# Altium footprint library Connector.PcbLib: 148 footprints (part 2 of 10)
Each footprint in its own frame and in the unit in brackets; x right, y up, seen from the top. Pads: shape width x height; smd on the part's side, far side on the other; paste and mask are expansions set on the pad; w line width, h text height; cw(c..) or ccw(c..) is an arc to the next point about the centre after c.
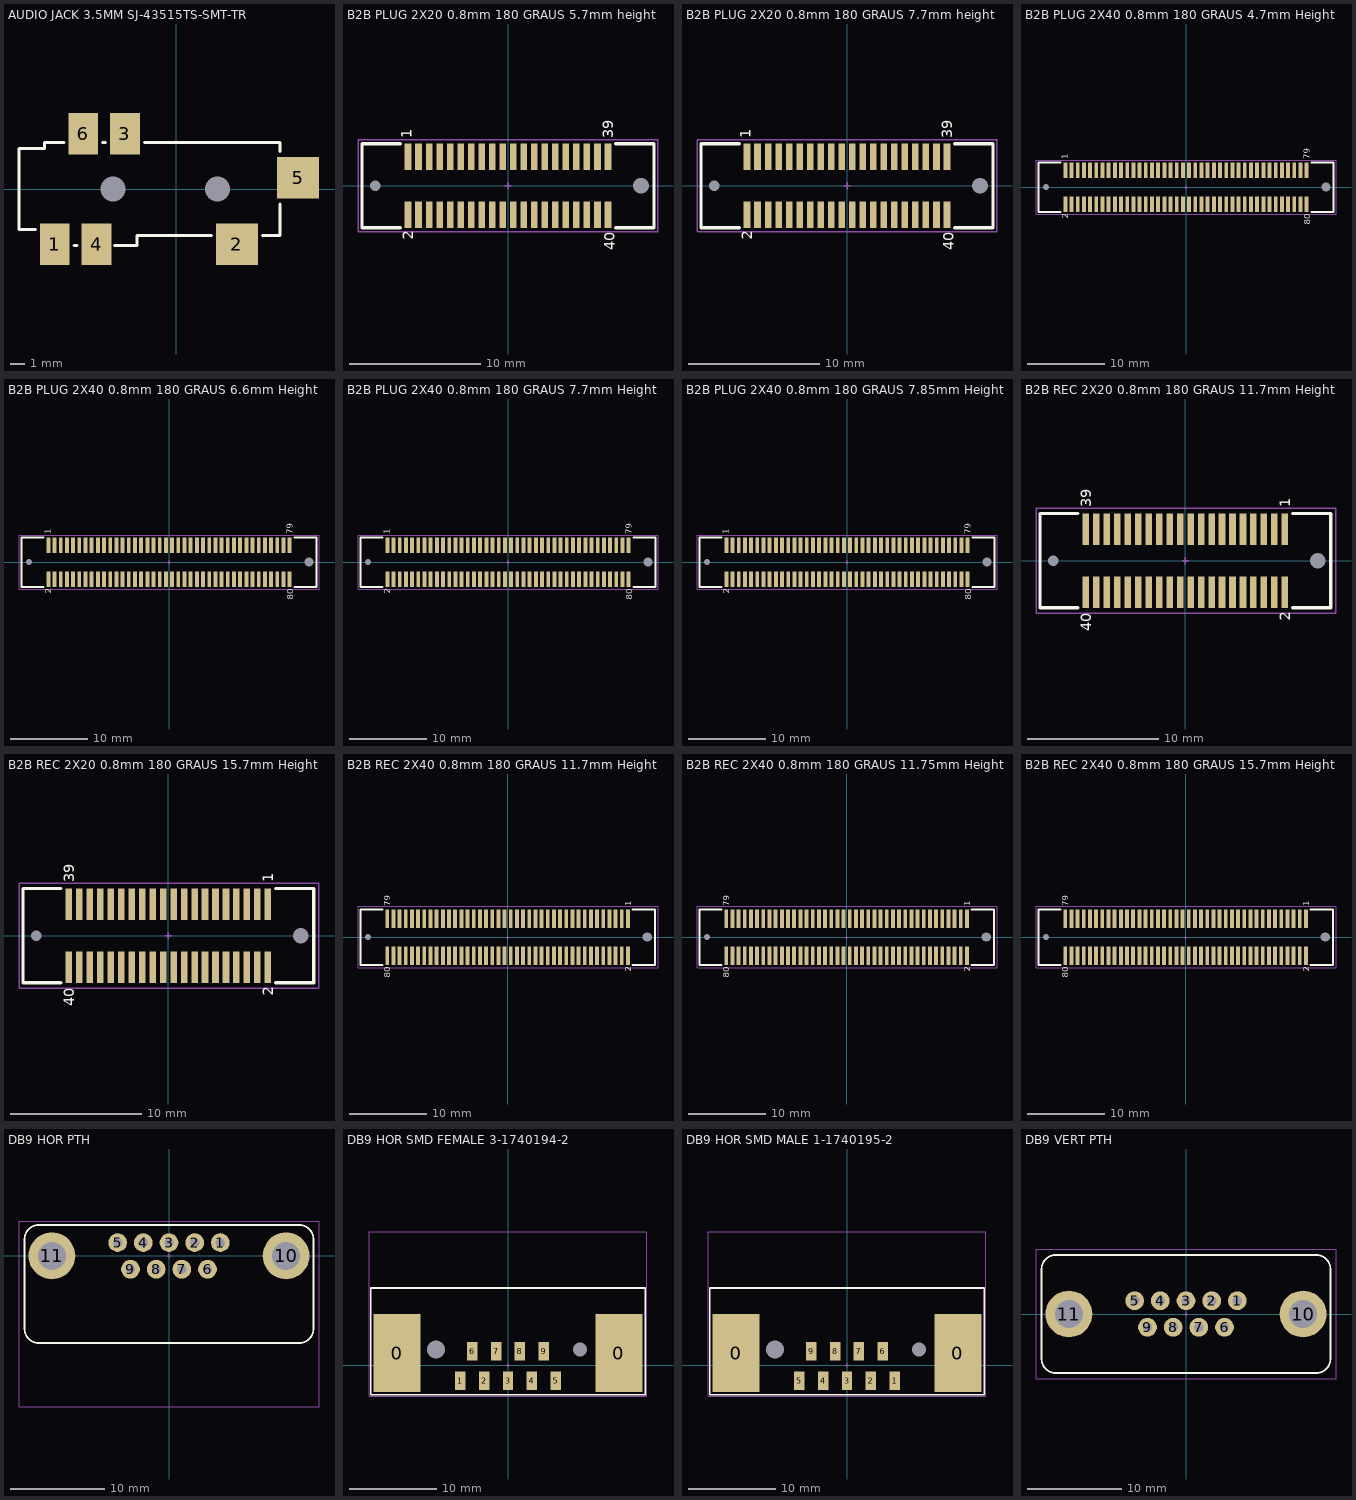
[diagram p1: the footprints below, top view; thin cyan lines are the x and y axes]

## AUDIO JACK 3.5MM SJ-43515TS-SMT-TR [mm]
pads (8):
  round 0 hole 1.7 unplated: 0(-4.25,0) 0(2.75,0)
  rect 2x2.8 smd: 1(-8.15,-3.7) 3(-3.45,3.7) 4(-5.35,-3.7) 6(-6.25,3.7)
  rect 2.8x2.8 smd: 2(4.05,-3.7) 5(8.15,0.75)
Top Overlay:
  lines w0.2: -9.45,-2.7 -10.55,-2.7 -10.55,2.7 -8.85,2.7 -8.85,3.1 -7.55,3.1 ; -6.85,-3.8 -6.65,-3.8 ; -4.95,3.1 -4.75,3.1 ; -4.15,-3.8 -2.65,-3.8 -2.65,-3.1 2.35,-3.1 ; -2.15,3.1 6.95,3.1 6.95,2.5 ; 5.75,-3.1 6.95,-3.1 6.95,-1
3D body "sj-43515ts-smt.STEP": height 5.1, standoff -0.7, extent -10.45,-4.5 8.75,4.5

## B2B PLUG 2X20 0.8mm 180 GRAUS 5.7mm height [mm]
height 5.7
pads (42):
  rect 0x0 hole 0.8 unplated: 0(-10.1,0)
  rect 0x0 hole 1.2 unplated: 0(10.1,0)
  rect 0.5x2 smd: 1(-7.6,2.2) 2(-7.6,-2.2) 3(-6.8,2.2) 4(-6.8,-2.2) 5(-6,2.2) 6(-6,-2.2) 7(-5.2,2.2) 8(-5.2,-2.2) 9(-4.4,2.2) 10(-4.4,-2.2) 11(-3.6,2.2) 12(-3.6,-2.2) 13(-2.8,2.2) 14(-2.8,-2.2) 15(-2,2.2) 16(-2,-2.2) 17(-1.2,2.2) 18(-1.2,-2.2) 19(-0.4,2.2) 20(-0.4,-2.2) 21(0.4,2.2) 22(0.4,-2.2) 23(1.2,2.2) 24(1.2,-2.2) 25(2,2.2) 26(2,-2.2) 27(2.8,2.2) 28(2.8,-2.2) 29(3.6,2.2) 30(3.6,-2.2) 31(4.4,2.2) 32(4.4,-2.2) 33(5.2,2.2) 34(5.2,-2.2) 35(6,2.2) 36(6,-2.2) 37(6.8,2.2) 38(6.8,-2.2) 39(7.6,2.2) 40(7.6,-2.2)
Top Overlay:
  lines w0.254: -8.2,-3.2 -11.1,-3.2 -11.1,3.2 -8.2,3.2 ; 8.2,-3.2 11.1,-3.2 11.1,3.2 8.2,3.2
  text "2" at -7.2,-4.1 h0.8
  text "1" at -7.3,3.6 h0.8
  text "40" at 8.1,-4.9 h0.8
  text "39" at 8,3.6 h0.8
Mechanical 15:
  lines w0.1: -0.25,0 0.25,0 ; 0,-0.25 0,0.25 ; -11.4,-3.5 -11.4,3.5 11.4,3.5 11.4,-3.5 -11.4,-3.5
3D body "Plug 61083-042x0xxx.STEP": height 5.7, standoff -0.65, extent -10.9,-3 10.9,3

## B2B PLUG 2X20 0.8mm 180 GRAUS 7.7mm height [mm]
height 7.7
pads (42):
  rect 0x0 hole 0.8 unplated: 0(-10.1,0)
  rect 0x0 hole 1.2 unplated: 0(10.1,0)
  rect 0.5x2 smd: 1(-7.6,2.2) 2(-7.6,-2.2) 3(-6.8,2.2) 4(-6.8,-2.2) 5(-6,2.2) 6(-6,-2.2) 7(-5.2,2.2) 8(-5.2,-2.2) 9(-4.4,2.2) 10(-4.4,-2.2) 11(-3.6,2.2) 12(-3.6,-2.2) 13(-2.8,2.2) 14(-2.8,-2.2) 15(-2,2.2) 16(-2,-2.2) 17(-1.2,2.2) 18(-1.2,-2.2) 19(-0.4,2.2) 20(-0.4,-2.2) 21(0.4,2.2) 22(0.4,-2.2) 23(1.2,2.2) 24(1.2,-2.2) 25(2,2.2) 26(2,-2.2) 27(2.8,2.2) 28(2.8,-2.2) 29(3.6,2.2) 30(3.6,-2.2) 31(4.4,2.2) 32(4.4,-2.2) 33(5.2,2.2) 34(5.2,-2.2) 35(6,2.2) 36(6,-2.2) 37(6.8,2.2) 38(6.8,-2.2) 39(7.6,2.2) 40(7.6,-2.2)
Top Overlay:
  lines w0.254: -8.2,-3.2 -11.1,-3.2 -11.1,3.2 -8.2,3.2 ; 8.2,-3.2 11.1,-3.2 11.1,3.2 8.2,3.2
  text "39" at 8,3.6 h0.8
  text "40" at 8.1,-4.9 h0.8
  text "1" at -7.3,3.6 h0.8
  text "2" at -7.2,-4.1 h0.8
Mechanical 15:
  lines w0.1: -0.25,0 0.25,0 ; 0,-0.25 0,0.25 ; -11.4,-3.5 11.4,-3.5 11.4,3.5 -11.4,3.5 -11.4,-3.5
3D body "s61083-044x0xxx.stp": height 7.65, standoff -0.7, extent -10.9,-3 10.9,3

## B2B PLUG 2X40 0.8mm 180 GRAUS 4.7mm Height [mm]
height 4.7
pads (82):
  rect 0x0 hole 0.8 unplated: 0(-18.1,0)
  rect 0x0 hole 1.2 unplated: 0(18.1,0)
  rect 0.5x2 smd: 1(-15.6,2.2) 2(-15.6,-2.2) 3(-14.8,2.2) 4(-14.8,-2.2) 5(-14,2.2) 6(-14,-2.2) 7(-13.2,2.2) 8(-13.2,-2.2) 9(-12.4,2.2) 10(-12.4,-2.2) 11(-11.6,2.2) 12(-11.6,-2.2) 13(-10.8,2.2) 14(-10.8,-2.2) 15(-10,2.2) 16(-10,-2.2) 17(-9.2,2.2) 18(-9.2,-2.2) 19(-8.4,2.2) 20(-8.4,-2.2) 21(-7.6,2.2) 22(-7.6,-2.2) 23(-6.8,2.2) 24(-6.8,-2.2) 25(-6,2.2) 26(-6,-2.2) 27(-5.2,2.2) 28(-5.2,-2.2) 29(-4.4,2.2) 30(-4.4,-2.2) 31(-3.6,2.2) 32(-3.6,-2.2) 33(-2.8,2.2) 34(-2.8,-2.2) 35(-2,2.2) 36(-2,-2.2) 37(-1.2,2.2) 38(-1.2,-2.2) 39(-0.4,2.2) 40(-0.4,-2.2) 41(0.4,2.2) 42(0.4,-2.2) 43(1.2,2.2) 44(1.2,-2.2) 45(2,2.2) 46(2,-2.2) 47(2.8,2.2) 48(2.8,-2.2) 49(3.6,2.2) 50(3.6,-2.2) 51(4.4,2.2) 52(4.4,-2.2) 53(5.2,2.2) 54(5.2,-2.2) 55(6,2.2) 56(6,-2.2) 57(6.8,2.2) 58(6.8,-2.2) 59(7.6,2.2) 60(7.6,-2.2) 61(8.4,2.2) 62(8.4,-2.2) 63(9.2,2.2) 64(9.2,-2.2) 65(10,2.2) 66(10,-2.2) 67(10.8,2.2) 68(10.8,-2.2) 69(11.6,2.2) 70(11.6,-2.2) 71(12.4,2.2) 72(12.4,-2.2) 73(13.2,2.2) 74(13.2,-2.2) 75(14,2.2) 76(14,-2.2) 77(14.8,2.2) 78(14.8,-2.2) 79(15.6,2.2) 80(15.6,-2.2)
Top Overlay:
  lines w0.254: -16.2,-3.2 -19.1,-3.2 -19.1,3.2 -16.2,3.2 ; 16.2,-3.2 19.1,-3.2 19.1,3.2 16.2,3.2
  text "2" at -15.2,-4.1 h0.8
  text "1" at -15.3,3.6 h0.8
  text "80" at 16.1,-4.9 h0.8
  text "79" at 16,3.6 h0.8
Mechanical 15:
  lines w0.1: -0.25,0 0.25,0 ; 0,-0.25 0,0.25 ; -19.4,-3.5 -19.4,3.5 19.4,3.5 19.4,-3.5 -19.4,-3.5
3D body "s61083-081x0xxx.stp": height 4.65, standoff -0.7, extent -18.9,-3 18.9,3

## B2B PLUG 2X40 0.8mm 180 GRAUS 6.6mm Height [mm]
height 6.6
pads (82):
  rect 0x0 hole 0.8 unplated: 0(-18.1,0)
  rect 0x0 hole 1.2 unplated: 0(18.1,0)
  rect 0.5x2 smd: 1(-15.6,2.2) 2(-15.6,-2.2) 3(-14.8,2.2) 4(-14.8,-2.2) 5(-14,2.2) 6(-14,-2.2) 7(-13.2,2.2) 8(-13.2,-2.2) 9(-12.4,2.2) 10(-12.4,-2.2) 11(-11.6,2.2) 12(-11.6,-2.2) 13(-10.8,2.2) 14(-10.8,-2.2) 15(-10,2.2) 16(-10,-2.2) 17(-9.2,2.2) 18(-9.2,-2.2) 19(-8.4,2.2) 20(-8.4,-2.2) 21(-7.6,2.2) 22(-7.6,-2.2) 23(-6.8,2.2) 24(-6.8,-2.2) 25(-6,2.2) 26(-6,-2.2) 27(-5.2,2.2) 28(-5.2,-2.2) 29(-4.4,2.2) 30(-4.4,-2.2) 31(-3.6,2.2) 32(-3.6,-2.2) 33(-2.8,2.2) 34(-2.8,-2.2) 35(-2,2.2) 36(-2,-2.2) 37(-1.2,2.2) 38(-1.2,-2.2) 39(-0.4,2.2) 40(-0.4,-2.2) 41(0.4,2.2) 42(0.4,-2.2) 43(1.2,2.2) 44(1.2,-2.2) 45(2,2.2) 46(2,-2.2) 47(2.8,2.2) 48(2.8,-2.2) 49(3.6,2.2) 50(3.6,-2.2) 51(4.4,2.2) 52(4.4,-2.2) 53(5.2,2.2) 54(5.2,-2.2) 55(6,2.2) 56(6,-2.2) 57(6.8,2.2) 58(6.8,-2.2) 59(7.6,2.2) 60(7.6,-2.2) 61(8.4,2.2) 62(8.4,-2.2) 63(9.2,2.2) 64(9.2,-2.2) 65(10,2.2) 66(10,-2.2) 67(10.8,2.2) 68(10.8,-2.2) 69(11.6,2.2) 70(11.6,-2.2) 71(12.4,2.2) 72(12.4,-2.2) 73(13.2,2.2) 74(13.2,-2.2) 75(14,2.2) 76(14,-2.2) 77(14.8,2.2) 78(14.8,-2.2) 79(15.6,2.2) 80(15.6,-2.2)
Top Overlay:
  lines w0.254: -16.2,-3.2 -19.1,-3.2 -19.1,3.2 -16.2,3.2 ; 16.2,-3.2 19.1,-3.2 19.1,3.2 16.2,3.2
  text "2" at -15.2,-4.1 h0.8
  text "1" at -15.3,3.6 h0.8
  text "80" at 16.1,-4.9 h0.8
  text "79" at 16,3.6 h0.8
Mechanical 15:
  lines w0.1: -0.25,0 0.25,0 ; 0,-0.25 0,0.25 ; -19.4,-3.5 -19.4,3.5 19.4,3.5 19.4,-3.5 -19.4,-3.5
3D body "c-5179030-3-o3-3d.STEP": height 6.6, standoff -1, extent -18.9,-3 18.9,3

## B2B PLUG 2X40 0.8mm 180 GRAUS 7.7mm Height [mm]
height 7.7
pads (82):
  rect 0x0 hole 0.8 unplated: 0(-18.1,0)
  rect 0x0 hole 1.2 unplated: 0(18.1,0)
  rect 0.5x2 smd: 1(-15.6,2.2) 2(-15.6,-2.2) 3(-14.8,2.2) 4(-14.8,-2.2) 5(-14,2.2) 6(-14,-2.2) 7(-13.2,2.2) 8(-13.2,-2.2) 9(-12.4,2.2) 10(-12.4,-2.2) 11(-11.6,2.2) 12(-11.6,-2.2) 13(-10.8,2.2) 14(-10.8,-2.2) 15(-10,2.2) 16(-10,-2.2) 17(-9.2,2.2) 18(-9.2,-2.2) 19(-8.4,2.2) 20(-8.4,-2.2) 21(-7.6,2.2) 22(-7.6,-2.2) 23(-6.8,2.2) 24(-6.8,-2.2) 25(-6,2.2) 26(-6,-2.2) 27(-5.2,2.2) 28(-5.2,-2.2) 29(-4.4,2.2) 30(-4.4,-2.2) 31(-3.6,2.2) 32(-3.6,-2.2) 33(-2.8,2.2) 34(-2.8,-2.2) 35(-2,2.2) 36(-2,-2.2) 37(-1.2,2.2) 38(-1.2,-2.2) 39(-0.4,2.2) 40(-0.4,-2.2) 41(0.4,2.2) 42(0.4,-2.2) 43(1.2,2.2) 44(1.2,-2.2) 45(2,2.2) 46(2,-2.2) 47(2.8,2.2) 48(2.8,-2.2) 49(3.6,2.2) 50(3.6,-2.2) 51(4.4,2.2) 52(4.4,-2.2) 53(5.2,2.2) 54(5.2,-2.2) 55(6,2.2) 56(6,-2.2) 57(6.8,2.2) 58(6.8,-2.2) 59(7.6,2.2) 60(7.6,-2.2) 61(8.4,2.2) 62(8.4,-2.2) 63(9.2,2.2) 64(9.2,-2.2) 65(10,2.2) 66(10,-2.2) 67(10.8,2.2) 68(10.8,-2.2) 69(11.6,2.2) 70(11.6,-2.2) 71(12.4,2.2) 72(12.4,-2.2) 73(13.2,2.2) 74(13.2,-2.2) 75(14,2.2) 76(14,-2.2) 77(14.8,2.2) 78(14.8,-2.2) 79(15.6,2.2) 80(15.6,-2.2)
Top Overlay:
  lines w0.254: -16.2,-3.2 -19.1,-3.2 -19.1,3.2 -16.2,3.2 ; 16.2,-3.2 19.1,-3.2 19.1,3.2 16.2,3.2
  text "79" at 16,3.6 h0.8
  text "80" at 16.1,-4.9 h0.8
  text "1" at -15.3,3.6 h0.8
  text "2" at -15.2,-4.1 h0.8
Mechanical 15:
  lines w0.1: -0.25,0 0.25,0 ; 0,-0.25 0,0.25 ; -19.4,-3.5 19.4,-3.5 19.4,3.5 -19.4,3.5 -19.4,-3.5
3D body "61083-084x0xx.stp": height 7.65, standoff -0.7, extent -18.9,-3 18.9,3

## B2B PLUG 2X40 0.8mm 180 GRAUS 7.85mm Height [mm]
height 7.85
pads (82):
  rect 0x0 hole 0.8 unplated: 0(-18.1,0)
  rect 0x0 hole 1.2 unplated: 0(18.1,0)
  rect 0.5x2 smd: 1(-15.6,2.2) 2(-15.6,-2.2) 3(-14.8,2.2) 4(-14.8,-2.2) 5(-14,2.2) 6(-14,-2.2) 7(-13.2,2.2) 8(-13.2,-2.2) 9(-12.4,2.2) 10(-12.4,-2.2) 11(-11.6,2.2) 12(-11.6,-2.2) 13(-10.8,2.2) 14(-10.8,-2.2) 15(-10,2.2) 16(-10,-2.2) 17(-9.2,2.2) 18(-9.2,-2.2) 19(-8.4,2.2) 20(-8.4,-2.2) 21(-7.6,2.2) 22(-7.6,-2.2) 23(-6.8,2.2) 24(-6.8,-2.2) 25(-6,2.2) 26(-6,-2.2) 27(-5.2,2.2) 28(-5.2,-2.2) 29(-4.4,2.2) 30(-4.4,-2.2) 31(-3.6,2.2) 32(-3.6,-2.2) 33(-2.8,2.2) 34(-2.8,-2.2) 35(-2,2.2) 36(-2,-2.2) 37(-1.2,2.2) 38(-1.2,-2.2) 39(-0.4,2.2) 40(-0.4,-2.2) 41(0.4,2.2) 42(0.4,-2.2) 43(1.2,2.2) 44(1.2,-2.2) 45(2,2.2) 46(2,-2.2) 47(2.8,2.2) 48(2.8,-2.2) 49(3.6,2.2) 50(3.6,-2.2) 51(4.4,2.2) 52(4.4,-2.2) 53(5.2,2.2) 54(5.2,-2.2) 55(6,2.2) 56(6,-2.2) 57(6.8,2.2) 58(6.8,-2.2) 59(7.6,2.2) 60(7.6,-2.2) 61(8.4,2.2) 62(8.4,-2.2) 63(9.2,2.2) 64(9.2,-2.2) 65(10,2.2) 66(10,-2.2) 67(10.8,2.2) 68(10.8,-2.2) 69(11.6,2.2) 70(11.6,-2.2) 71(12.4,2.2) 72(12.4,-2.2) 73(13.2,2.2) 74(13.2,-2.2) 75(14,2.2) 76(14,-2.2) 77(14.8,2.2) 78(14.8,-2.2) 79(15.6,2.2) 80(15.6,-2.2)
Top Overlay:
  lines w0.254: -16.2,-3.2 -19.1,-3.2 -19.1,3.2 -16.2,3.2 ; 16.2,-3.2 19.1,-3.2 19.1,3.2 16.2,3.2
  text "2" at -15.2,-4.1 h0.8
  text "1" at -15.3,3.6 h0.8
  text "80" at 16.1,-4.9 h0.8
  text "79" at 16,3.6 h0.8
Mechanical 15:
  lines w0.1: -0.25,0 0.25,0 ; 0,-0.25 0,0.25 ; -19.4,-3.5 -19.4,3.5 19.4,3.5 19.4,-3.5 -19.4,-3.5
3D body "c-3-5177986-3-d-3d.stp": height 7.6, standoff -0.5, extent -18.9,-3 18.9,3

## B2B REC 2X20 0.8mm 180 GRAUS 11.7mm Height [mm]
height 11.7
pads (42):
  rect 0x0 hole 0.8 unplated: 0(-10.1,0)
  rect 0x0 hole 1.2 unplated: 0(10.1,0)
  rect 0.5x2.4 smd: 1(7.6,2.4) 2(7.6,-2.4) 3(6.8,2.4) 4(6.8,-2.4) 5(6,2.4) 6(6,-2.4) 7(5.2,2.4) 8(5.2,-2.4) 9(4.4,2.4) 10(4.4,-2.4) 11(3.6,2.4) 12(3.6,-2.4) 13(2.8,2.4) 14(2.8,-2.4) 15(2,2.4) 16(2,-2.4) 17(1.2,2.4) 18(1.2,-2.4) 19(0.4,2.4) 20(0.4,-2.4) 21(-0.4,2.4) 22(-0.4,-2.4) 23(-1.2,2.4) 24(-1.2,-2.4) 25(-2,2.4) 26(-2,-2.4) 27(-2.8,2.4) 28(-2.8,-2.4) 29(-3.6,2.4) 30(-3.6,-2.4) 31(-4.4,2.4) 32(-4.4,-2.4) 33(-5.2,2.4) 34(-5.2,-2.4) 35(-6,2.4) 36(-6,-2.4) 37(-6.8,2.4) 38(-6.8,-2.4) 39(-7.6,2.4) 40(-7.6,-2.4)
Top Overlay:
  lines w0.254: -8.2,-3.6 -11.1,-3.6 -11.1,3.6 -8.2,3.6 ; 8.2,-3.6 11.1,-3.6 11.1,3.6 8.2,3.6
  text "2" at 8,-4.6 h0.8
  text "1" at 8,4.1 h0.8
  text "40" at -7.2,-5.4 h0.8
  text "39" at -7.2,4.1 h0.8
Mechanical 15:
  lines w0.1: -11.4,-4 -11.4,4 ; -11.4,-4 11.5,-4 11.5,4 -11.4,4 ; -0.25,0 0.25,0 ; 0,-0.25 0,0.25
3D body "Rec 61082-043x0xxx.STEP": height 11.7, standoff -0.65, extent -10.9,-3.4 10.9,3.4

## B2B REC 2X20 0.8mm 180 GRAUS 15.7mm Height [mm]
height 15.7
pads (42):
  rect 0x0 hole 0.8 unplated: 0(-10.1,0)
  rect 0x0 hole 1.2 unplated: 0(10.1,0)
  rect 0.5x2.4 smd: 1(7.6,2.4) 2(7.6,-2.4) 3(6.8,2.4) 4(6.8,-2.4) 5(6,2.4) 6(6,-2.4) 7(5.2,2.4) 8(5.2,-2.4) 9(4.4,2.4) 10(4.4,-2.4) 11(3.6,2.4) 12(3.6,-2.4) 13(2.8,2.4) 14(2.8,-2.4) 15(2,2.4) 16(2,-2.4) 17(1.2,2.4) 18(1.2,-2.4) 19(0.4,2.4) 20(0.4,-2.4) 21(-0.4,2.4) 22(-0.4,-2.4) 23(-1.2,2.4) 24(-1.2,-2.4) 25(-2,2.4) 26(-2,-2.4) 27(-2.8,2.4) 28(-2.8,-2.4) 29(-3.6,2.4) 30(-3.6,-2.4) 31(-4.4,2.4) 32(-4.4,-2.4) 33(-5.2,2.4) 34(-5.2,-2.4) 35(-6,2.4) 36(-6,-2.4) 37(-6.8,2.4) 38(-6.8,-2.4) 39(-7.6,2.4) 40(-7.6,-2.4)
Top Overlay:
  lines w0.254: -8.2,-3.6 -11.1,-3.6 -11.1,3.6 -8.2,3.6 ; 8.2,-3.6 11.1,-3.6 11.1,3.6 8.2,3.6
  text "39" at -7.2,4.1 h0.8
  text "40" at -7.2,-5.4 h0.8
  text "1" at 8,4.1 h0.8
  text "2" at 8,-4.6 h0.8
Mechanical 15:
  lines w0.1: -11.4,-4 -11.4,4 ; -11.4,-4 11.5,-4 11.5,4 -11.4,4 ; -0.25,0 0.25,0 ; 0,-0.25 0,0.25
3D body "Rec 61082_044x0xxx.STEP": height 15.71, standoff -0.69, extent -10.9,-3.4 10.9,3.4

## B2B REC 2X40 0.8mm 180 GRAUS 11.7mm Height [mm]
height 11.7
pads (82):
  rect 0x0 hole 0.8 unplated: 0(-18.1,0)
  rect 0x0 hole 1.2 unplated: 0(18.1,0)
  rect 0.5x2.4 smd: 1(15.6,2.4) 2(15.6,-2.4) 3(14.8,2.4) 4(14.8,-2.4) 5(14,2.4) 6(14,-2.4) 7(13.2,2.4) 8(13.2,-2.4) 9(12.4,2.4) 10(12.4,-2.4) 11(11.6,2.4) 12(11.6,-2.4) 13(10.8,2.4) 14(10.8,-2.4) 15(10,2.4) 16(10,-2.4) 17(9.2,2.4) 18(9.2,-2.4) 19(8.4,2.4) 20(8.4,-2.4) 21(7.6,2.4) 22(7.6,-2.4) 23(6.8,2.4) 24(6.8,-2.4) 25(6,2.4) 26(6,-2.4) 27(5.2,2.4) 28(5.2,-2.4) 29(4.4,2.4) 30(4.4,-2.4) 31(3.6,2.4) 32(3.6,-2.4) 33(2.8,2.4) 34(2.8,-2.4) 35(2,2.4) 36(2,-2.4) 37(1.2,2.4) 38(1.2,-2.4) 39(0.4,2.4) 40(0.4,-2.4) 41(-0.4,2.4) 42(-0.4,-2.4) 43(-1.2,2.4) 44(-1.2,-2.4) 45(-2,2.4) 46(-2,-2.4) 47(-2.8,2.4) 48(-2.8,-2.4) 49(-3.6,2.4) 50(-3.6,-2.4) 51(-4.4,2.4) 52(-4.4,-2.4) 53(-5.2,2.4) 54(-5.2,-2.4) 55(-6,2.4) 56(-6,-2.4) 57(-6.8,2.4) 58(-6.8,-2.4) 59(-7.6,2.4) 60(-7.6,-2.4) 61(-8.4,2.4) 62(-8.4,-2.4) 63(-9.2,2.4) 64(-9.2,-2.4) 65(-10,2.4) 66(-10,-2.4) 67(-10.8,2.4) 68(-10.8,-2.4) 69(-11.6,2.4) 70(-11.6,-2.4) 71(-12.4,2.4) 72(-12.4,-2.4) 73(-13.2,2.4) 74(-13.2,-2.4) 75(-14,2.4) 76(-14,-2.4) 77(-14.8,2.4) 78(-14.8,-2.4) 79(-15.6,2.4) 80(-15.6,-2.4)
Top Overlay:
  lines w0.254: -16.2,-3.6 -19.1,-3.6 -19.1,3.6 -16.2,3.6 ; 16.2,-3.6 19.1,-3.6 19.1,3.6 16.2,3.6
  text "79" at -15.2,4 h0.8
  text "80" at -15.2,-5.3 h0.8
  text "1" at 16,4 h0.8
  text "2" at 16,-4.5 h0.8
Mechanical 15:
  lines w0.1: -0.25,0 0.25,0 ; 0,-0.25 0,0.25 ; -19.4,-4 19.5,-4 19.5,4 -19.4,4 -19.4,-4
3D body "s61082-083x0xxx.stp": height 11.65, standoff -0.7, extent -18.9,-3.4 18.9,3.4

## B2B REC 2X40 0.8mm 180 GRAUS 11.75mm Height [mm]
height 11.75
pads (82):
  rect 0x0 hole 0.8 unplated: 0(-18.1,0)
  rect 0x0 hole 1.2 unplated: 0(18.1,0)
  rect 0.5x2.4 smd: 1(15.6,2.4) 2(15.6,-2.4) 3(14.8,2.4) 4(14.8,-2.4) 5(14,2.4) 6(14,-2.4) 7(13.2,2.4) 8(13.2,-2.4) 9(12.4,2.4) 10(12.4,-2.4) 11(11.6,2.4) 12(11.6,-2.4) 13(10.8,2.4) 14(10.8,-2.4) 15(10,2.4) 16(10,-2.4) 17(9.2,2.4) 18(9.2,-2.4) 19(8.4,2.4) 20(8.4,-2.4) 21(7.6,2.4) 22(7.6,-2.4) 23(6.8,2.4) 24(6.8,-2.4) 25(6,2.4) 26(6,-2.4) 27(5.2,2.4) 28(5.2,-2.4) 29(4.4,2.4) 30(4.4,-2.4) 31(3.6,2.4) 32(3.6,-2.4) 33(2.8,2.4) 34(2.8,-2.4) 35(2,2.4) 36(2,-2.4) 37(1.2,2.4) 38(1.2,-2.4) 39(0.4,2.4) 40(0.4,-2.4) 41(-0.4,2.4) 42(-0.4,-2.4) 43(-1.2,2.4) 44(-1.2,-2.4) 45(-2,2.4) 46(-2,-2.4) 47(-2.8,2.4) 48(-2.8,-2.4) 49(-3.6,2.4) 50(-3.6,-2.4) 51(-4.4,2.4) 52(-4.4,-2.4) 53(-5.2,2.4) 54(-5.2,-2.4) 55(-6,2.4) 56(-6,-2.4) 57(-6.8,2.4) 58(-6.8,-2.4) 59(-7.6,2.4) 60(-7.6,-2.4) 61(-8.4,2.4) 62(-8.4,-2.4) 63(-9.2,2.4) 64(-9.2,-2.4) 65(-10,2.4) 66(-10,-2.4) 67(-10.8,2.4) 68(-10.8,-2.4) 69(-11.6,2.4) 70(-11.6,-2.4) 71(-12.4,2.4) 72(-12.4,-2.4) 73(-13.2,2.4) 74(-13.2,-2.4) 75(-14,2.4) 76(-14,-2.4) 77(-14.8,2.4) 78(-14.8,-2.4) 79(-15.6,2.4) 80(-15.6,-2.4)
Top Overlay:
  lines w0.254: -16.2,-3.6 -19.1,-3.6 -19.1,3.6 -16.2,3.6 ; 16.2,-3.6 19.1,-3.6 19.1,3.6 16.2,3.6
  text "79" at -15.2,4 h0.8
  text "80" at -15.2,-5.3 h0.8
  text "1" at 16,4 h0.8
  text "2" at 16,-4.5 h0.8
Mechanical 15:
  lines w0.1: -0.25,0 0.25,0 ; 0,-0.25 0,0.25 ; -19.4,-4 19.5,-4 19.5,4 -19.4,4 -19.4,-4
3D body "c-5-5179010-3-o-3d.STEP": height 11.75, standoff -0.5, extent -18.9,-3.4 18.9,3.4

## B2B REC 2X40 0.8mm 180 GRAUS 15.7mm Height [mm]
height 15.7
pads (82):
  rect 0x0 hole 0.8 unplated: 0(-18.1,0)
  rect 0x0 hole 1.2 unplated: 0(18.1,0)
  rect 0.5x2.4 smd: 1(15.6,2.4) 2(15.6,-2.4) 3(14.8,2.4) 4(14.8,-2.4) 5(14,2.4) 6(14,-2.4) 7(13.2,2.4) 8(13.2,-2.4) 9(12.4,2.4) 10(12.4,-2.4) 11(11.6,2.4) 12(11.6,-2.4) 13(10.8,2.4) 14(10.8,-2.4) 15(10,2.4) 16(10,-2.4) 17(9.2,2.4) 18(9.2,-2.4) 19(8.4,2.4) 20(8.4,-2.4) 21(7.6,2.4) 22(7.6,-2.4) 23(6.8,2.4) 24(6.8,-2.4) 25(6,2.4) 26(6,-2.4) 27(5.2,2.4) 28(5.2,-2.4) 29(4.4,2.4) 30(4.4,-2.4) 31(3.6,2.4) 32(3.6,-2.4) 33(2.8,2.4) 34(2.8,-2.4) 35(2,2.4) 36(2,-2.4) 37(1.2,2.4) 38(1.2,-2.4) 39(0.4,2.4) 40(0.4,-2.4) 41(-0.4,2.4) 42(-0.4,-2.4) 43(-1.2,2.4) 44(-1.2,-2.4) 45(-2,2.4) 46(-2,-2.4) 47(-2.8,2.4) 48(-2.8,-2.4) 49(-3.6,2.4) 50(-3.6,-2.4) 51(-4.4,2.4) 52(-4.4,-2.4) 53(-5.2,2.4) 54(-5.2,-2.4) 55(-6,2.4) 56(-6,-2.4) 57(-6.8,2.4) 58(-6.8,-2.4) 59(-7.6,2.4) 60(-7.6,-2.4) 61(-8.4,2.4) 62(-8.4,-2.4) 63(-9.2,2.4) 64(-9.2,-2.4) 65(-10,2.4) 66(-10,-2.4) 67(-10.8,2.4) 68(-10.8,-2.4) 69(-11.6,2.4) 70(-11.6,-2.4) 71(-12.4,2.4) 72(-12.4,-2.4) 73(-13.2,2.4) 74(-13.2,-2.4) 75(-14,2.4) 76(-14,-2.4) 77(-14.8,2.4) 78(-14.8,-2.4) 79(-15.6,2.4) 80(-15.6,-2.4)
Top Overlay:
  lines w0.254: -16.2,-3.6 -19.1,-3.6 -19.1,3.6 -16.2,3.6 ; 16.2,-3.6 19.1,-3.6 19.1,3.6 16.2,3.6
  text "2" at 16,-4.5 h0.8
  text "1" at 16,4 h0.8
  text "80" at -15.2,-5.3 h0.8
  text "79" at -15.2,4 h0.8
Mechanical 15:
  lines w0.1: -0.25,0 0.25,0 ; 0,-0.25 0,0.25 ; -19.4,-4 -19.4,4 19.5,4 19.5,-4 -19.4,-4
3D body "61082_084x0xxx.stp": height 15.7, standoff -0.7, extent -18.9,-3.4 18.9,3.4

## DB9 HOR PTH [mm]
pads (11):
  round 2 hole 1: 1(5.48,1.42) 2(2.74,1.42) 3(0,1.42) 4(-2.74,1.42) 5(-5.48,1.42) 6(4.11,-1.42) 7(1.37,-1.42) 8(-1.37,-1.42) 9(-4.11,-1.42)
  round 5 hole 3: 10(12.49,0) 11(-12.49,0)
Top Overlay:
  lines w0.2: -15.4,-7.8 ccw(c-13.9,-7.8) -13.9,-9.3 13.9,-9.3 ccw(c13.9,-7.8) 15.4,-7.8 15.4,1.8 ccw(c13.9,1.8) 13.9,3.3 -13.9,3.3 ccw(c-13.9,1.8) -15.4,1.8 -15.4,-7.8
Mechanical 15:
  lines w0.1: -0.25,0 0.25,0 ; 0,-0.25 0,0.25 ; -16,-16.1 16,-16.1 16,3.7 -16,3.7 -16,-16.1
3D body "db9.STEP": height 12.55, standoff -3.2, extent -15.45,-15.65 15.45,3.1

## DB9 HOR SMD FEMALE 3-1740194-2 [mm]
pads (13):
  rect 5.45x9 smd: 0(-12.775,1.4) 0(12.775,1.4)
  rect 1.2x2.1 smd: 1(-5.48,-1.8) 2(-2.74,-1.8) 3(0,-1.8) 4(2.74,-1.8) 5(5.48,-1.8) 6(-4.11,1.6) 7(-1.37,1.6) 8(1.37,1.6) 9(4.11,1.6)
  round 0 hole 2.1 unplated: F(-8.3,1.8)
  round 0 hole 1.6 unplated: F(8.3,1.8)
Top Overlay:
  lines w0.2: -15.8,-3.4 -15.8,8.9 15.8,8.9 15.8,-3.4 -15.8,-3.4
Mechanical 15:
  lines w0.1: -0.25,0 0.25,0 ; 0,-0.25 0,0.25 ; -16,-3.6 16,-3.6 16,15.4 -16,15.4 -16,-3.6
3D body "c-3-1740194-2-d-3d.STEP": height 9.85, standoff -2.65, extent -15.4,-2.775 15.4,14.925

## DB9 HOR SMD MALE 1-1740195-2 [mm]
pads (13):
  rect 5.45x9 smd: 0(-12.775,1.4) 0(12.775,1.4)
  rect 1.2x2.1 smd: 1(5.48,-1.8) 2(2.74,-1.8) 3(0,-1.8) 4(-2.74,-1.8) 5(-5.48,-1.8) 6(4.11,1.6) 7(1.37,1.6) 8(-1.37,1.6) 9(-4.11,1.6)
  round 0 hole 2.1 unplated: F(-8.3,1.8)
  round 0 hole 1.6 unplated: F(8.3,1.8)
Top Overlay:
  lines w0.2: -15.8,-3.4 -15.8,8.9 15.8,8.9 15.8,-3.4 -15.8,-3.4
Mechanical 15:
  lines w0.1: -0.25,0 0.25,0 ; 0,-0.25 0,0.25 ; -16,-3.6 16,-3.6 16,15.4 -16,15.4 -16,-3.6
3D body "c-1-1740195-2-d-3d.STEP": height 9.85, standoff -2.65, extent -15.4,-2.475 15.4,14.925

## DB9 VERT PTH [mm]
pads (11):
  round 2 hole 1: 1(5.48,1.42) 2(2.74,1.42) 3(0,1.42) 4(-2.74,1.42) 5(-5.48,1.42) 6(4.11,-1.42) 7(1.37,-1.42) 8(-1.37,-1.42) 9(-4.11,-1.42)
  round 5 hole 3: 10(12.49,0) 11(-12.49,0)
Top Overlay:
  lines w0.2: -15.4,-4.8 ccw(c-13.9,-4.8) -13.9,-6.3 13.9,-6.3 ccw(c13.9,-4.8) 15.4,-4.8 15.4,4.8 ccw(c13.9,4.8) 13.9,6.3 -13.9,6.3 ccw(c-13.9,4.8) -15.4,4.8 -15.4,-4.8
Mechanical 15:
  lines w0.1: -0.25,0 0.25,0 ; 0,-0.25 0,0.25 ; -16,-6.9 -16,6.9 16,6.9 16,-6.9 -16,-6.9
3D body "DB9 vert 5747150-07-SLDPRT.STEP": height 12.35, standoff -3.12, extent -15.443,-6.299 15.443,6.299